# Altium footprint library 19-Resistors.PcbLib: 199 footprints (part 13 of 13)
Each footprint in its own frame and in the unit in brackets; x right, y up, seen from the top. Pads: shape width x height; smd on the part's side, far side on the other; paste and mask are expansions set on the pad; w line width, h text height; cw(c..) or ccw(c..) is an arc to the next point about the centre after c.
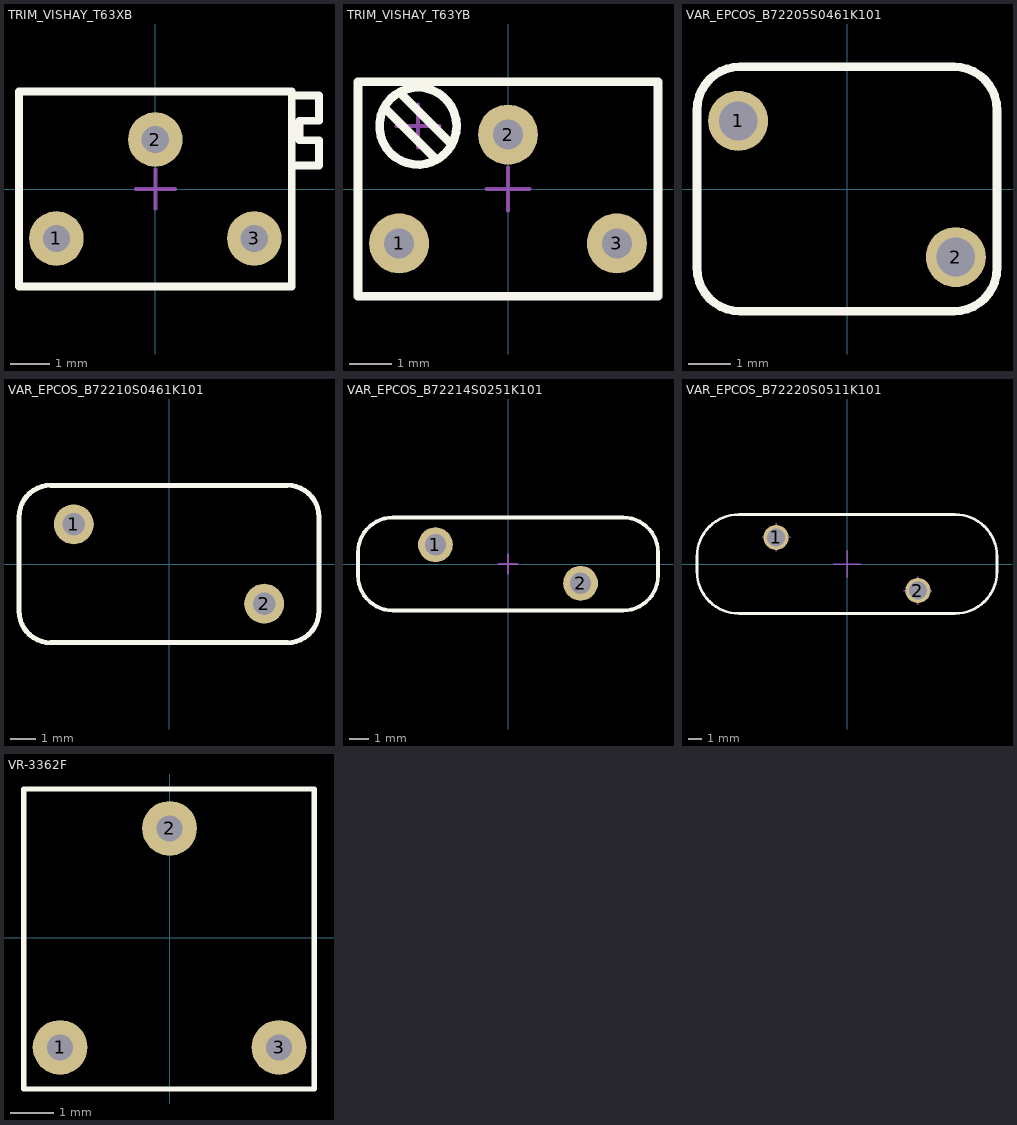
[diagram p12: the footprints below, top view; thin cyan lines are the x and y axes]

## TRIM_VISHAY_T63XB [mm] "Trimming Potentiometer VISHAY T63YB Series (Side Adjustment)"
height 7
pads (3):
  round 1.4 hole 0.7: 1(-2.54,-1.27) 2(0,1.27) 3(2.54,-1.27)
Top Overlay:
  lines w0.2: 3.5,0.6 4.2,0.6 4.2,1.25 3.7,1.25 3.7,1.75 4.2,1.75 4.2,2.4 3.5,2.4 ; -3.5,-2.5 -3.5,2.5 3.5,2.5 3.5,-2.5 -3.5,-2.5
Mechanical 8:
  lines w0.1: -3.04,-1.27 -2.54,-1.27 ; -2.54,-1.77 -2.54,-1.27 ; -2.54,-0.77 -2.54,-1.27 ; -2.04,-1.27 -2.54,-1.27 ; -0.5,0 0,0 ; -0.5,1.27 0,1.27 ; 0,-0.5 0,0 ; 0,0.5 0,0 ; 0,0.77 0,1.27 ; 0,1.77 0,1.27 ; 0.5,0 0,0 ; 0.5,1.27 0,1.27 ; 2.04,-1.27 2.54,-1.27 ; 2.54,-1.77 2.54,-1.27 ; 2.54,-0.77 2.54,-1.27 ; 3.04,-1.27 2.54,-1.27
Mechanical 14:
  lines w0.1: 3.5,0.6 4.2,0.6 4.2,1.25 3.7,1.25 3.7,1.75 4.2,1.75 4.2,2.4 3.5,2.4 ; -3.5,-2.5 3.5,-2.5 3.5,2.5 -3.5,2.5 -3.5,-2.5
3D body "TRIM_VISHAY_T63XB.stp": height 7, standoff -3.6, extent -3.5,-2.5 4.2,2.5

## TRIM_VISHAY_T63YB [mm] "Trimming Potentiometer VISHAY T63YB Series (Top Adjustment)"
height 7.7
pads (3):
  round 1.4 hole 0.7: 1(-2.54,-1.27) 2(0,1.27) 3(2.54,-1.27)
Top Overlay:
  circle w0.2: c-2.1,1.47 r0.9
  lines w0.2: -2.888,1.905 -1.665,0.682 ; -2.535,2.258 -1.312,1.035 ; -3.5,-2.5 3.5,-2.5 3.5,2.5 -3.5,2.5 -3.5,-2.5
Mechanical 8:
  lines w0.1: -3.04,-1.27 -2.54,-1.27 ; -2.6,1.47 -2.1,1.47 ; -2.54,-1.77 -2.54,-1.27 ; -2.54,-0.77 -2.54,-1.27 ; -2.1,0.97 -2.1,1.47 ; -2.1,1.97 -2.1,1.47 ; -2.04,-1.27 -2.54,-1.27 ; -1.6,1.47 -2.1,1.47 ; -0.5,0 0,0 ; -0.5,1.27 0,1.27 ; 0,-0.5 0,0 ; 0,0.5 0,0 ; 0,0.77 0,1.27 ; 0,1.77 0,1.27 ; 0.5,0 0,0 ; 0.5,1.27 0,1.27 ; 2.04,-1.27 2.54,-1.27 ; 2.54,-1.77 2.54,-1.27 ; 2.54,-0.77 2.54,-1.27 ; 3.04,-1.27 2.54,-1.27
Mechanical 14:
  circle w0.1: c-2.1,1.47 r0.9
  lines w0.1: -2.888,1.905 -1.665,0.682 ; -2.535,2.258 -1.312,1.035 ; -3.5,-2.5 -3.5,2.5 3.5,2.5 3.5,-2.5 -3.5,-2.5
3D body "TRIM_VISHAY_T63YB.stp": height 7.5, standoff -3.6, extent -3.4,-2.5 3.4,2.5

## VAR_EPCOS_B72205S0461K101 [mm] "EPCOS S05K460 Metal Oxyde Varistor, Body 7x5.7mm"
height 9
pads (2):
  round 1.4 hole 0.9: 1(-2.54,1.587) 2(2.54,-1.587)
Top Overlay:
  lines w0.2: -3.5,-1.85 ccw(c-2.5,-1.85) -2.5,-2.85 2.5,-2.85 ccw(c2.5,-1.85) 3.5,-1.85 3.5,1.85 ccw(c2.5,1.85) 2.5,2.85 -2.5,2.85 ccw(c-2.5,1.85) -3.5,1.85 -3.5,-1.85
Mechanical 13:
  circle w0.254: c-2.54,1.587 r0.3
Mechanical 14:
  lines w0.1: -3.5,-1.85 ccw(c-2.5,-1.85) -2.5,-2.85 2.5,-2.85 ccw(c2.5,-1.85) 3.5,-1.85 3.5,1.85 ccw(c2.5,1.85) 2.5,2.85 -2.5,2.85 ccw(c-2.5,1.85) -3.5,1.85 -3.5,-1.85
3D body: height 6, standoff -3.8, extent 2.241,-1.887 2.839,-1.288
3D body: height 6, standoff -3.8, extent -2.839,1.288 -2.241,1.887
3D body "VAR_EPCOS_B72205S0461K101.stp": height 9, standoff -3.6, extent -3.508,-2.858 3.492,2.842
3D body "v200-130.stp": height 0.02, standoff -1.65, extent -3.475,0.525 -1.475,2.525
3D body "v200-130.stp": height 0.02, standoff -1.65, extent 1.54,-2.587 3.54,-0.587

## VAR_EPCOS_B72210S0461K101 [mm] "EPCOS S10K460 Metal Oxyde Varistor, Body 6.3X12mm"
height 15
pads (2):
  round 1.6 hole 0.9: 1(-3.81,1.587) 2(3.81,-1.587)
Top Overlay:
  lines w0.2: 4.73,-3.15 ccw(c4.73,-1.88) 6,-1.88 6,1.88 ccw(c4.73,1.88) 4.73,3.15 -4.73,3.15 ccw(c-4.73,1.88) -6,1.88 -6,-1.88 ccw(c-4.73,-1.88) -4.73,-3.15 4.75,-3.15
Mechanical 14:
  lines w0.1: -6,-1.88 ccw(c-4.73,-1.88) -4.73,-3.15 4.73,-3.15 ccw(c4.73,-1.88) 6,-1.88 6,1.88 ccw(c4.73,1.88) 4.73,3.15 -4.73,3.15 ccw(c-4.73,1.88) -6,1.88 -6,-1.88
3D body "v200-130.stp": height 0.02, standoff -1.65, extent 2.81,-2.587 4.81,-0.587
3D body "v200-130.stp": height 0.02, standoff -1.65, extent -4.81,0.588 -2.81,2.588
3D body "VAR_EPCOS_B72210S0461K101.stp": height 15, standoff -3.6, extent -6,-3.15 6,3.15

## VAR_EPCOS_B72214S0251K101 [mm] "EPCOS B72214S0251K101 Metal Oxyde Varistor, 14mm Body Diameter"
height 18.5
pads (2):
  round 1.8 hole 1.1: 1(-3.75,1) 2(3.75,-1)
Top Overlay:
  lines w0.2: -7.75,-0.6 ccw(c-5.95,-0.6) -5.95,-2.4 5.95,-2.4 ccw(c5.95,-0.6) 7.75,-0.6 7.75,0.6 ccw(c5.95,0.6) 5.95,2.4 -5.95,2.4 ccw(c-5.95,0.6) -7.75,0.6 -7.75,-0.6
Mechanical 8:
  lines w0.1: -4.25,1 -3.75,1 ; -3.75,0.5 -3.75,1 ; -3.75,1.5 -3.75,1 ; -3.25,1 -3.75,1 ; -0.5,0 0,0 ; 0,-0.5 0,0 ; 0,0.5 0,0 ; 0.5,0 0,0 ; 3.25,-1 3.75,-1 ; 3.75,-1.5 3.75,-1 ; 3.75,-0.5 3.75,-1 ; 4.25,-1 3.75,-1
Mechanical 14:
  lines w0.1: -7.75,-0.6 ccw(c-5.95,-0.6) -5.95,-2.4 5.95,-2.4 ccw(c5.95,-0.6) 7.75,-0.6 7.75,0.6 ccw(c5.95,0.6) 5.95,2.4 -5.95,2.4 ccw(c-5.95,0.6) -7.75,0.6 -7.75,-0.6
3D body "VAR_EPCOS_B72214S0251K101.stp": height 18.5, standoff -3.6, extent -7.75,-2.4 7.75,2.4
3D body "v200-130.stp": height 0.02, standoff -1.65, extent -4.75,0 -2.75,2
3D body "v200-130.stp": height 0.02, standoff -1.65, extent 2.75,-2 4.75,0

## VAR_EPCOS_B72220S0511K101 [mm] "EPCOS B72220S0511K101 Metal Oxyde Varistor, Body 7.1X21.5mm"
height 26
pads (2):
  round 1.8 hole 1.3: 1(-5.08,1.905) 2(5.08,-1.905)
Top Overlay:
  lines w0.2: -10.75,-0.55 ccw(c-7.75,-0.55) -7.75,-3.55 7.75,-3.55 ccw(c7.75,-0.55) 10.75,-0.55 10.75,0.55 ccw(c7.75,0.55) 7.75,3.55 -7.75,3.55 ccw(c-7.75,0.55) -10.75,0.55 -10.75,-0.55
Mechanical 8:
  lines w0.1: -6.08,1.905 -5.08,1.905 ; -5.08,0.905 -5.08,1.905 ; -5.08,2.905 -5.08,1.905 ; -4.08,1.905 -5.08,1.905 ; -1,0 0,0 ; 0,-1 0,0 ; 0,1 0,0 ; 1,0 0,0 ; 4.08,-1.905 5.08,-1.905 ; 5.08,-2.905 5.08,-1.905 ; 5.08,-0.905 5.08,-1.905 ; 6.08,-1.905 5.08,-1.905
3D body "v200-130.stp": height 0.02, standoff -1.65, extent 4.08,-2.905 6.08,-0.905
3D body "v200-130.stp": height 0.02, standoff -1.65, extent -6.08,0.905 -4.08,2.905
3D body "VAR_EPCOS_ B72220S0511K101.stp": height 26, standoff -2.1, extent -10.75,-3.55 10.75,3.55

## VR-3362F [mm]
height 26
pads (3):
  round 1.27 hole 0.6: 1(-2.54,-2.54) 2(0,2.54) 3(2.54,-2.54)
Top Overlay:
  lines w0.127: -3.378,-3.505 3.353,-3.505 3.353,3.454 -3.378,3.454 -3.378,-3.505
3D body "v200-130.stp": height 0.02, standoff -1.65, extent -1,1.54 1,3.54
3D body "v200-130.stp": height 0.02, standoff -1.65, extent 1.54,-3.54 3.54,-1.54
3D body "v200-130.stp": height 0.02, standoff -1.65, extent -3.54,-3.54 -1.54,-1.54
3D body "vr-3362.stp": height 4.9, standoff -3, extent -3.425,-3.475 3.425,3.475